# Altium footprint library PcbLib_Discrete_ThroughHole.PcbLib: 104 footprints (part 1 of 7)
Each footprint in its own frame and in the unit in brackets; x right, y up, seen from the top. Pads: shape width x height; smd on the part's side, far side on the other; paste and mask are expansions set on the pad; w line width, h text height; cw(c..) or ccw(c..) is an arc to the next point about the centre after c.
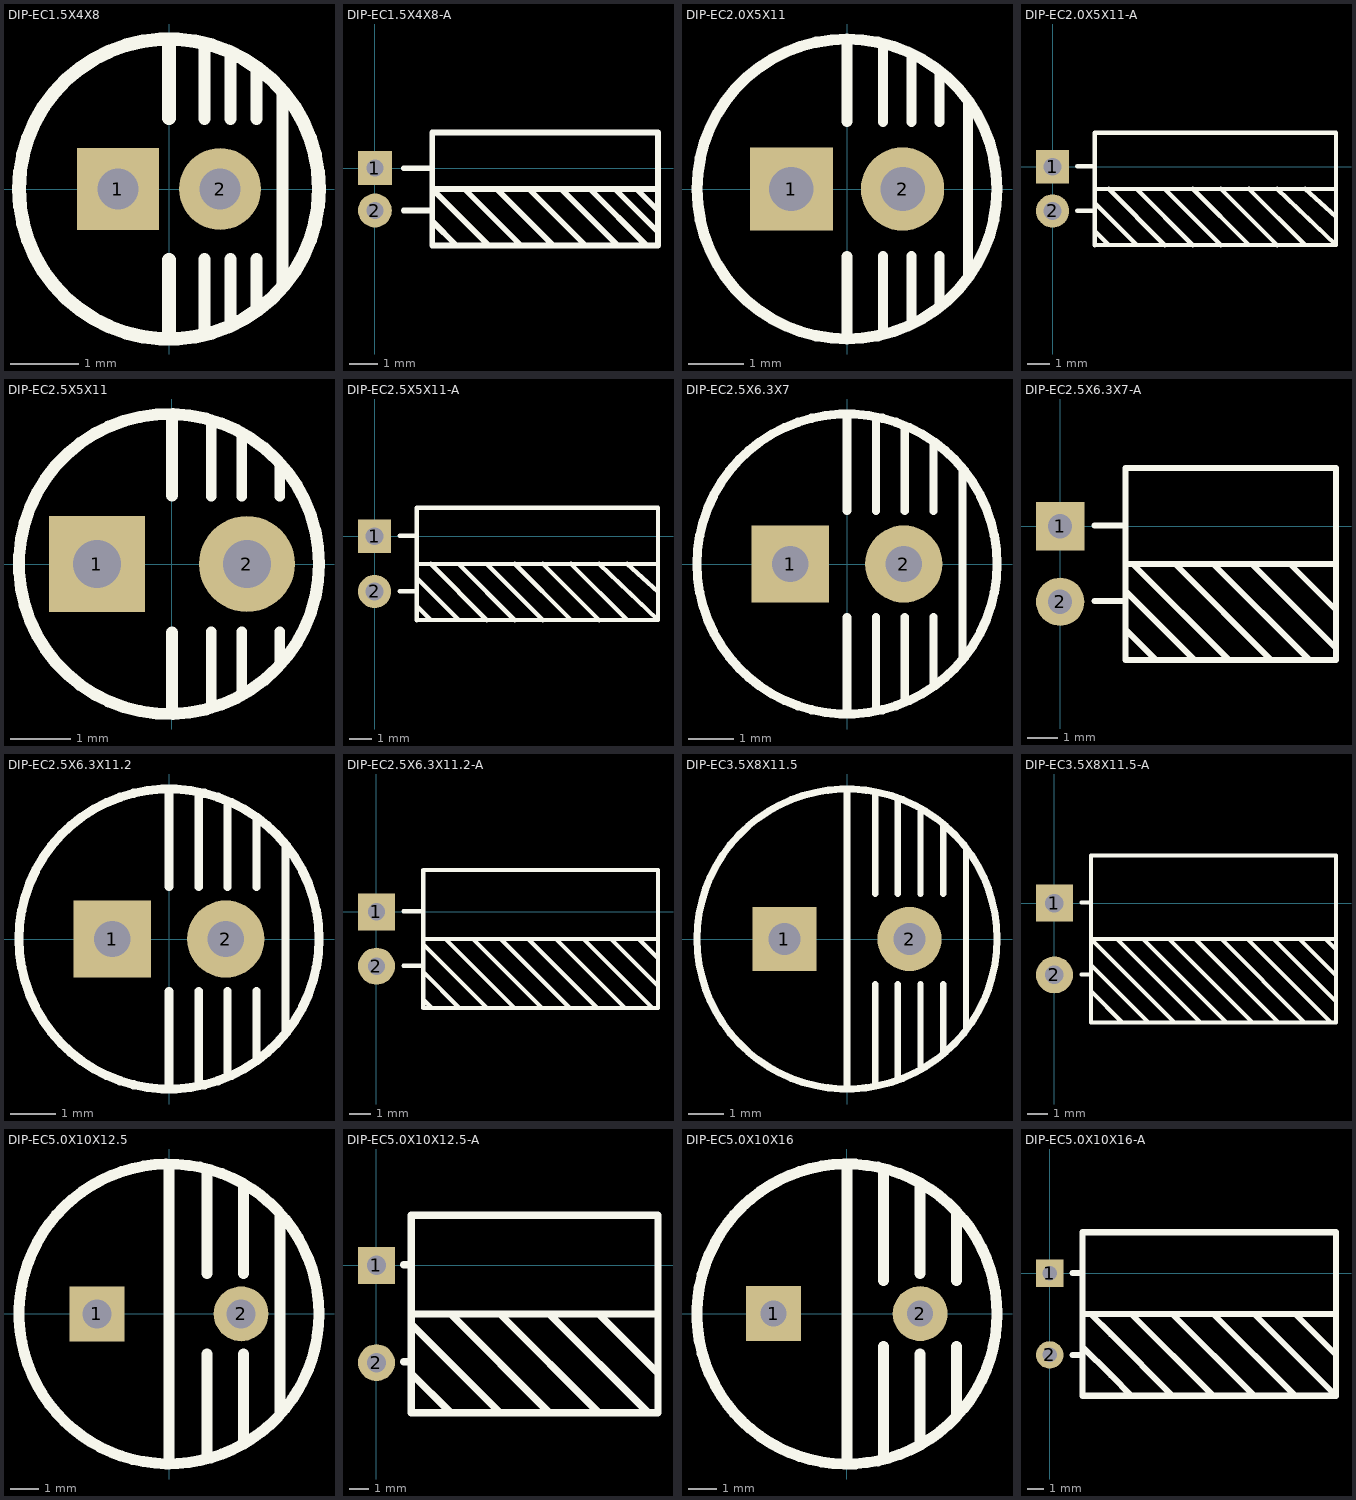
[diagram p0: the footprints below, top view; thin cyan lines are the x and y axes]

## DIP-EC1.5X4X8 [mm]
pads (2):
  rect 1.2x1.2 hole 0.6: 1(-0.75,0)
  round 1.2 hole 0.6: 2(0.75,0)
Top Overlay:
  circle w0.2: c0,0 r2.2
  lines w0.178: 0.52,-2.046 0.52,-1.03 ; 0.52,1.03 0.52,2.046 ; 0.901,-1.93 0.901,-1.03 ; 0.901,1.03 0.901,1.93 ; 1.282,-1.767 1.282,-1.03 ; 1.282,1.03 1.282,1.767 ; 1.663,-1.397 1.663,1.397
  lines w0.2: 0,-2.108 0,-1.041 ; 0,1.041 0,2.108
3D body "CAP 1.5X4X8.STEP": height 8.04, standoff -3.46, extent -2.01,-1.999 2.01,1.999

## DIP-EC1.5X4X8-A [mm]
pads (2):
  rect 1.2x1.2 hole 0.6: 1(0,0)
  round 1.2 hole 0.6: 2(0,-1.5)
Top Overlay:
  lines w0.2: 1.016,-1.5 2,-1.5 ; 1.016,0 2,0 ; 2.032,-1.881 2.889,-2.738 2.921,-2.738 ; 2.921,-1.627 2.032,-0.738 ; 3.175,-0.738 5.175,-2.738 5.207,-2.738 ; 4.064,-2.738 4.032,-2.738 2.032,-0.738 ; 4.318,-0.738 6.318,-2.738 6.35,-2.738 ; 5.461,-0.738 7.461,-2.738 7.493,-2.738 ; 6.604,-0.738 8.604,-2.738 8.636,-2.738 ; 7.62,-0.738 9.597,-2.715 ccw(c9.652,-2.661) 9.652,-2.738 ; 8.509,-0.738 10.031,-2.26 cw(c10.03,-2.262) 10.032,-2.262 ; 9.271,-0.738 10.031,-1.498 cw(c10.03,-1.5) 10.032,-1.5 ; 10.032,-0.738 2.032,-0.738 ; 2.032,-2.738 10.032,-2.738 10.032,1.262 2.032,1.262 2.032,-2.738
3D body "CAP 1.5X4X8-H.STEP": height 4.02, standoff -3.48, extent -0.254,-2.772 9.996,1.248

## DIP-EC2.0X5X11 [mm]
pads (2):
  rect 1.5x1.5 hole 0.8: 1(-1,0)
  round 1.5 hole 0.8: 2(1,0)
Top Overlay:
  circle w0.2: c0,0 r2.7
  lines w0.178: 0.651,-2.529 0.651,-1.208 ; 0.651,1.208 0.651,2.529 ; 1.159,-2.351 1.159,-1.208 ; 1.159,1.208 1.159,2.351 ; 1.667,-2.032 1.667,-1.208 ; 1.667,1.208 1.667,2.032 ; 2.175,-1.6 2.175,1.575
  lines w0.2: 0,-2.667 0,-1.219 ; 0,1.219 0,2.667
3D body "CAP 2.0X5X11.STEP": height 11.04, standoff -3.42, extent -2.505,-2.5 2.505,2.5

## DIP-EC2.0X5X11-A [mm]
pads (2):
  rect 1.5x1.5 hole 0.8: 1(0,0)
  round 1.5 hole 0.8: 2(0,-2)
Top Overlay:
  lines w0.2: 1.118,-1.984 1.905,-1.984 ; 1.118,0.016 1.905,0.016 ; 1.905,-2.905 2.54,-3.54 ; 1.905,-1.635 3.81,-3.54 ; 1.905,-1.006 12.827,-1 ; 2.54,-1 5.08,-3.548 ; 3.81,-1.005 6.35,-3.547 ; 5.08,-1.004 7.62,-3.545 ; 6.35,-1 8.89,-3.54 ; 7.62,-1.003 10.16,-3.543 ; 8.89,-1.002 11.43,-3.541 ; 10.16,-1.001 12.827,-3.54 ; 11.43,-1.001 12.827,-2.27 ; 12.827,-3.54 1.905,-3.552 1.905,1.54 12.827,1.54 12.827,-3.54
3D body "CAP 2.0X5X11-H.STEP": height 5.02, standoff -3.48, extent -0.254,-3.521 12.956,1.489

## DIP-EC2.5X5X11 [mm]
pads (2):
  rect 1.6x1.6 hole 0.8: 1(-1.25,0)
  round 1.6 hole 0.8: 2(1.25,0)
Top Overlay:
  circle w0.2: c-0.05,0 r2.5
  lines w0.178: 0.655,-2.402 0.655,-1.132 ; 0.655,1.132 0.655,2.402 ; 1.163,-2.123 1.163,-1.132 ; 1.163,1.132 1.163,2.123 ; 1.798,-1.615 1.798,-1.132 ; 1.798,1.132 1.798,1.615
  lines w0.2: 0,-2.489 0,-1.143 ; 0,1.143 0,2.489
3D body "CAP 2.5X5X11.STEP": height 11.03, standoff -3.43, extent -2.505,-2.5 2.505,2.5

## DIP-EC2.5X5X11-A [mm]
pads (2):
  rect 1.5x1.5 hole 0.8: 1(0,0)
  round 1.5 hole 0.8: 2(0,-2.5)
Top Overlay:
  lines w0.2: 1.143,-2.484 1.905,-2.484 ; 1.143,0.016 1.905,0.016 ; 1.905,-3.155 2.54,-3.79 ; 1.905,-1.885 3.81,-3.79 ; 1.905,-1.256 12.827,-1.25 ; 2.54,-1.25 5.08,-3.798 ; 3.81,-1.255 6.35,-3.797 ; 5.08,-1.254 7.62,-3.795 ; 6.35,-1.25 8.89,-3.79 ; 7.62,-1.253 10.16,-3.793 ; 8.89,-1.252 11.43,-3.791 ; 10.16,-1.251 12.827,-3.79 ; 11.43,-1.251 12.827,-2.52 ; 12.827,-3.79 1.905,-3.802 1.905,1.29 12.827,1.29 12.827,-3.79
3D body "CAP 2.5X5X11-H.STEP": height 5.02, standoff -3.48, extent -0.255,-3.74 12.955,1.27

## DIP-EC2.5X6.3X7 [mm]
pads (2):
  rect 1.7x1.7 hole 0.8: 1(-1.25,0)
  round 1.7 hole 0.8: 2(1.25,0)
Top Overlay:
  circle w0.2: c0,0 r3.3
  lines w0.178: 0.635,-3.175 0.635,-1.168 ; 0.635,1.168 0.635,3.175 ; 1.27,-2.972 1.27,-1.168 ; 1.27,1.168 1.27,2.972 ; 1.905,-2.642 1.905,-1.168 ; 1.905,1.168 1.905,2.642 ; 2.54,-2.032 2.54,2.032
  lines w0.2: 0,-3.288 0,-1.179 ; 0,1.179 0,3.288
3D body "CAP 2.5X6.3X7.STEP": height 7.03, standoff -3.38, extent -3.155,-3.149 3.155,3.149

## DIP-EC2.5X6.3X7-A [mm]
pads (2):
  rect 1.6x1.6 hole 0.8: 1(0,0)
  round 1.6 hole 0.8: 2(0,-2.5)
Top Overlay:
  lines w0.2: 1.143,-2.48 2.159,-2.48 ; 1.143,0.02 2.159,0.02 ; 2.159,-3.409 3.175,-4.425 ; 2.159,-2.139 4.445,-4.425 ; 2.159,-1.25 9.144,-1.25 ; 2.413,-1.25 5.588,-4.425 5.715,-4.425 ; 3.81,-1.25 6.985,-4.425 ; 5.08,-1.25 8.255,-4.425 ; 6.35,-1.25 9.144,-4.044 ; 7.62,-1.25 9.144,-2.774 ; 2.159,-4.425 9.144,-4.425 9.144,1.925 2.159,1.925 2.159,-4.425
3D body "CAP 2.5X6.3X7-H.STEP": height 6.32, standoff -3.48, extent -0.287,-4.385 8.923,1.925

## DIP-EC2.5X6.3X11.2 [mm]
pads (2):
  rect 1.7x1.7 hole 0.8: 1(-1.25,0)
  round 1.7 hole 0.8: 2(1.25,0)
Top Overlay:
  circle w0.2: c0,0 r3.3
  lines w0.178: 0.655,-3.175 0.655,-1.143 ; 0.655,1.143 0.655,3.175 ; 1.29,-2.997 1.29,-1.143 ; 1.29,1.143 1.29,2.997 ; 1.925,-2.667 1.925,-1.143 ; 1.925,1.143 1.925,2.667 ; 2.56,-2.032 2.56,2.032
  lines w0.2: 0,-3.277 0,-1.154 ; 0,1.154 0,3.277
3D body "CAP 2.5X6.3X11.2.STEP": height 11.23, standoff -3.38, extent -3.155,-3.15 3.155,3.15

## DIP-EC2.5X6.3X11.2-A [mm]
pads (2):
  rect 1.7x1.7 hole 0.8: 1(0,0)
  round 1.7 hole 0.8: 2(0,-2.5)
Top Overlay:
  lines w0.2: 1.245,-2.48 2.032,-2.48 ; 1.245,0.02 2.032,0.02 ; 2.159,-4.044 2.54,-4.425 ; 2.159,-2.774 3.81,-4.425 ; 2.159,-1.504 5.08,-4.425 4.953,-4.425 ; 2.159,-1.25 12.954,-1.25 ; 3.175,-1.25 6.35,-4.425 ; 4.445,-1.25 7.62,-4.425 ; 5.715,-1.25 8.89,-4.425 ; 6.985,-1.25 10.16,-4.425 ; 8.255,-1.25 11.43,-4.425 ; 9.525,-1.25 12.7,-4.425 ; 10.795,-1.25 12.954,-3.409 ; 12.065,-1.25 12.954,-2.139 ; 2.159,-4.425 12.954,-4.425 12.954,1.925 2.159,1.925 2.159,-4.425
3D body "CAP 2.5X6.3X11.2-H.STEP": height 6.32, standoff -3.48, extent -0.254,-4.425 13.156,1.885

## DIP-EC3.5X8X11.5 [mm]
pads (2):
  rect 1.8x1.8 hole 0.9: 1(-1.75,0)
  round 1.8 hole 0.9: 2(1.75,0)
Top Overlay:
  circle w0.2: c0,0 r4.2
  lines w0.178: 0.79,-4.064 0.79,-1.27 ; 0.79,1.27 0.79,4.064 ; 1.425,-3.937 1.425,-1.27 ; 1.425,1.27 1.425,3.937 ; 2.06,-3.556 2.06,-1.27 ; 2.06,1.27 2.06,3.556 ; 2.695,-3.175 2.695,-1.27 ; 2.695,1.27 2.695,3.175 ; 3.33,-2.54 3.33,2.54
  lines w0.2: 0,-4.191 0,4.191
3D body "CAP 3.5X8X11.5.STEP": height 11.53, standoff -3.38, extent -4.005,-4 4.005,4

## DIP-EC3.5X8X11.5-A [mm]
pads (2):
  rect 1.8x1.8 hole 0.9: 1(0,0)
  round 1.8 hole 0.9: 2(0,-3.5)
Top Overlay:
  lines w0.2: 1.321,-3.472 1.778,-3.472 ; 1.321,0.028 1.778,0.028 ; 1.778,-4.29 3.302,-5.814 ; 1.778,-3.02 4.572,-5.814 ; 3.048,-1.75 7.112,-5.814 ; 4.318,-1.75 8.382,-5.814 ; 5.588,-1.75 9.652,-5.814 ; 5.842,-5.814 1.778,-1.75 13.716,-1.75 ; 6.858,-1.75 10.922,-5.814 ; 8.128,-1.75 12.192,-5.814 ; 9.398,-1.75 13.462,-5.814 ; 10.668,-1.75 13.716,-4.798 ; 11.938,-1.75 13.716,-3.528 ; 13.208,-1.75 13.716,-2.258 ; 1.778,-5.814 1.778,2.314 13.716,2.314 13.716,-5.814 1.778,-5.814
3D body "CAP 3.5X8X11.5-H.STEP": height 8.03, standoff -2.62, extent -0.381,-5.783 13.329,2.227

## DIP-EC5.0X10X12.5 [mm]
pads (2):
  rect 1.9x1.9 hole 1: 1(-2.5,0)
  round 1.9 hole 1: 2(2.5,0)
Top Overlay:
  circle w0.381: c0,0 r5.2
  lines w0.381: 0,-5.207 0,5.08 ; 1.31,-4.953 1.31,-1.397 ; 1.31,1.397 1.31,4.953 ; 2.58,-4.445 2.58,-1.397 ; 2.58,1.397 2.58,4.445 ; 3.85,-3.429 3.85,3.429
3D body "CAP 5.0X10X12.5.STEP": height 12.55, standoff -3.36, extent -5.005,-5.063 5.005,4.936

## DIP-EC5.0X10X12.5-A [mm]
pads (2):
  rect 1.9x1.9 hole 1: 1(0,0)
  round 1.9 hole 1: 2(0,-5)
Top Overlay:
  lines w0.381: 1.397,-4.96 1.778,-4.96 ; 1.397,0.04 1.778,0.04 ; 1.778,-5.548 3.81,-7.58 ; 1.778,-3.008 6.35,-7.58 ; 1.778,-2.5 14.41,-2.5 ; 3.81,-2.5 8.89,-7.58 ; 6.35,-2.5 11.43,-7.58 ; 8.89,-2.5 13.97,-7.58 ; 11.43,-2.5 14.478,-5.548 ; 1.778,-7.58 14.478,-7.58 14.478,2.58 1.778,2.58 1.778,-7.58
3D body "CAP 5.0X10X12.5-H.STEP": height 10.03, standoff -3.47, extent -0.381,-7.545 14.329,2.465

## DIP-EC5.0X10X16 [mm]
pads (2):
  rect 1.9x1.9 hole 0.9: 1(-2.54,0)
  round 1.9 hole 0.9: 2(2.54,0)
Top Overlay:
  circle w0.381: c0.006,-0.013 r5.2
  lines w0.381: 0.006,-5.197 0.006,5.072 ; 0.006,-5.082 0.006,-5.075 ; 0.006,-4.07 0.006,-4.064 ; 0.006,-3.054 0.006,-3.05 0.006,-3.043 ; 0.006,-2.032 0.006,-2.038 ; 0.006,1.01 0.006,1.016 ; 0.006,2.026 0.006,2.032 ; 0.006,4.058 0.006,4.064 ; 0.006,5.074 0.006,5.187 ; 1.27,-4.953 1.27,-1.143 ; 1.27,1.143 1.27,4.953 ; 2.54,-4.445 2.54,-1.397 ; 2.54,1.397 2.54,4.445 ; 3.81,-3.556 3.81,-1.143 ; 3.81,1.143 3.81,3.429 ; 0.006,-2.038 0.006,-2.038
3D body "CAP 5.0X10X16.STEP": height 16.04, standoff -3.37, extent -4.999,-5.061 5.011,4.936

## DIP-EC5.0X10X16-A [mm]
pads (2):
  rect 1.7x1.7 hole 0.9: 1(0,0)
  round 1.7 hole 0.9: 2(0,-5.08)
Top Overlay:
  lines w0.381: 1.422,-5.08 1.88,-5.08 ; 1.422,0 1.88,0 ; 2.032,-4.572 3.81,-6.35 5.08,-7.62 ; 2.032,-2.54 2.54,-2.54 ; 3.81,-2.54 17.78,-2.54 ; 4.064,-2.54 2.54,-2.54 ; 5.08,-2.54 10.16,-7.62 ; 7.62,-7.62 3.81,-3.81 2.54,-2.54 ; 7.62,-2.54 12.7,-7.62 ; 10.16,-2.54 15.24,-7.62 ; 12.7,-2.54 17.78,-7.62 ; 15.24,-2.54 17.78,-5.08 ; 17.78,-7.62 17.78,2.54 2.032,2.54 2.032,-7.62 17.78,-7.62
3D body "CAP 5.0X10X16-H.STEP": height 10.03, standoff -3.47, extent -0.254,-7.545 17.956,2.465